# Altium footprint library custom-case.PcbLib: 383 footprints (part 14 of 24)
Each footprint in its own frame and in the unit in brackets; x right, y up, seen from the top. Pads: shape width x height; smd on the part's side, far side on the other; paste and mask are expansions set on the pad; w line width, h text height; cw(c..) or ccw(c..) is an arc to the next point about the centre after c.
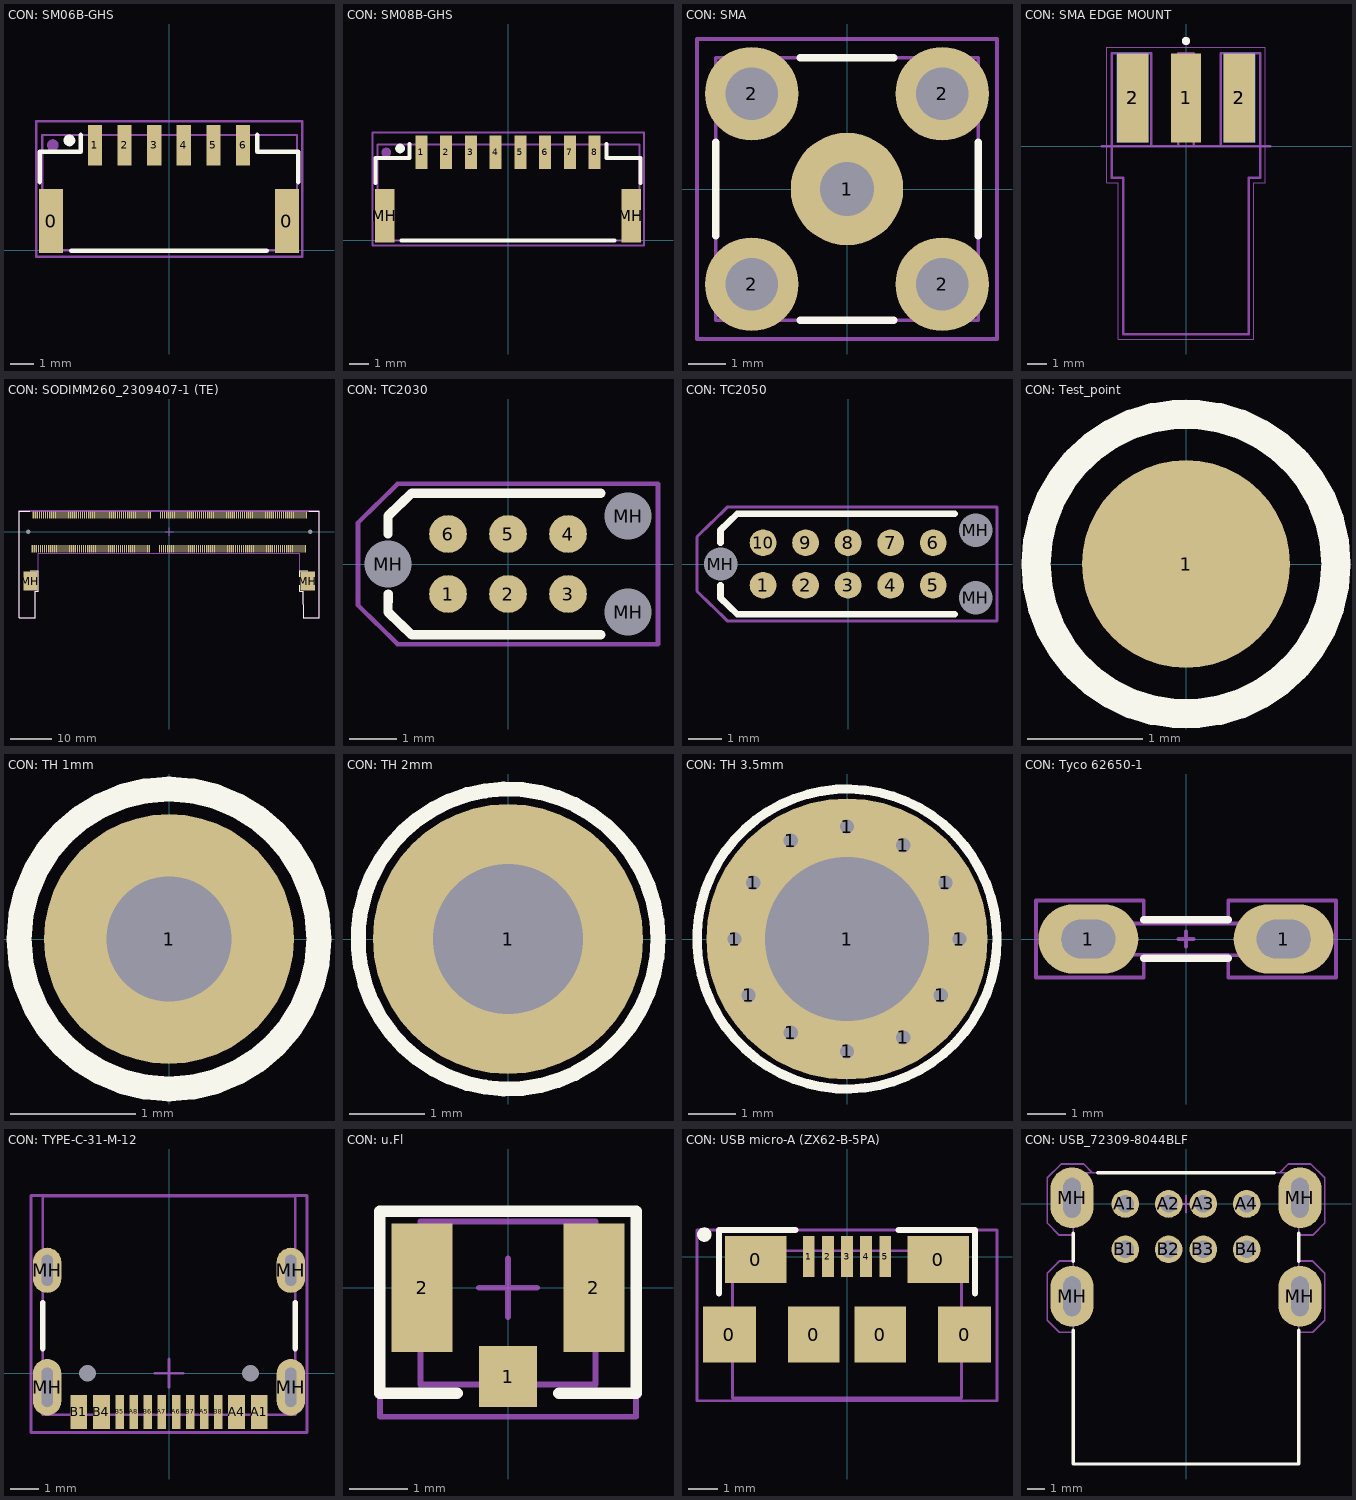
[diagram p13: the footprints below, top view; thin cyan lines are the x and y axes]

## CON: SM06B-GHS [mm]
pads (10):
  rect 1x2.7 smd: 0(-4.975,1.225) 0(4.975,1.225)
  rect 0.6x1.7 smd: 1(-3.125,4.425) 2(-1.875,4.425) 3(-0.625,4.425) 4(0.625,4.425) 5(1.875,4.425) 6(3.125,4.425)
  round 0.5 on Mech1: ""(-4.9,4.425)
  round 0.5 on Top Overlay: ""(-4.2,4.625)
Top Overlay:
  lines w0.2: -5.45,2.875 -5.45,4.15 -3.725,4.15 -3.725,4.85 ; -4.125,-0.025 4.125,-0.025 ; 3.725,4.85 3.725,4.15 5.45,4.15 5.45,2.875
Top Assy:
  lines w0.1: -5.35,0 -5.35,4.85 5.4,4.85 5.4,0 -5.35,0
Size Area:
  lines w0.1: -5.6,-0.275 -5.6,5.425 5.625,5.425 5.625,-0.275 -5.6,-0.275
3D body "SM06B-GHS-TB.STEP": height 4.33, standoff -0.02, extent -5.35,0 5.4,4.85

## CON: SM08B-GHS [mm]
pads (12):
  rect 0.6x1.7 smd: 1(-4.375,4.45) 2(-3.125,4.45) 3(-1.875,4.45) 4(-0.625,4.45) 5(0.625,4.45) 6(1.875,4.45) 7(3.125,4.45) 8(4.375,4.45)
  rect 1x2.7 smd: MH(-6.225,1.25) MH(6.225,1.25)
  round 0.5 on Mech1: ""(-6.15,4.45)
  round 0.5 on Top Overlay: ""(-5.45,4.65)
Top Overlay:
  lines w0.2: -6.7,2.9 -6.7,4.175 -4.975,4.175 -4.975,4.875 ; -5.375,0 5.375,0 ; 4.975,4.875 4.975,4.175 6.7,4.175 6.7,2.9
Top Assy:
  lines w0.1: 6.65,0 -6.6,0 -6.6,4.85 6.65,4.85 6.65,0.05
Size Area:
  lines w0.1: -6.85,-0.25 -6.85,5.45 6.875,5.45 6.875,-0.25 -6.85,-0.25
3D body "SM08B-GHS-TB.stp": height 4.25, standoff -0.05, extent -6.625,0 6.625,4.85

## CON: SMA [mm]
pads (5):
  round 3 hole 1.45: 1(0,0)
  round 2.5 hole 1.4: 2(-2.54,-2.54) 2(-2.54,2.54) 2(2.54,-2.54) 2(2.54,2.54)
Top Overlay:
  lines w0.2: -3.5,-1.25 -3.5,1.25 ; -1.25,-3.5 1.25,-3.5 ; -1.25,3.5 1.25,3.5 ; 3.5,-1.25 3.5,1.25
Top Assy:
  lines w0.1: -3.5,-3.5 -3.5,3.5 3.5,3.5 3.5,-3.5 -3.5,-3.5
Size Area:
  lines w0.1: -0.5,0 0.5,0 ; 0,-0.5 0,0.5 ; -4,-4 4,-4 4,4 -4,4 -4,-4
3D body "SMA_connector.STEP": height 9.53, standoff -3.94, extent -3.5,-3.5 3.5,3.5

## CON: SMA EDGE MOUNT [mm]
pads (5):
  rect 1.5x4.5 smd: 1(0,2.45)
  rect 1.6x4.5 smd far side: 2(-2.7,2.45) 2(2.7,2.45)
  rect 1.6x4.5 smd: 2(-2.7,2.45) 2(2.7,2.45)
Top Overlay:
  circle w0.2: c0,5.325 r0.1
Top Assy:
  lines w0.05: -4,-1.85 -3.425,-1.85 -3.425,-9.75 3.425,-9.75 3.425,-1.85 4.005,-1.85 4.005,5 -4,5 -4,-1.85
  lines w0.127: -4.25,0 -3.76,0 ; 4.25,0 3.76,0 ; -3.76,0 -3.76,4.7 -1.75,4.7 -1.75,0 -3.76,0 ; -3.76,0 -0.39,0 ; -3.76,0 -3.76,-1.6 -3.175,-1.6 -3.175,-9.5 3.175,-9.5 3.175,-1.6 3.76,-1.6 3.76,0 ; -0.39,0 -0.39,4.7 0.39,4.7 0.39,0 ; -0.39,0 0.39,0 ; 0.39,0 3.76,0 ; 3.76,0 1.75,0 1.75,4.7 3.76,4.7 3.76,0
3D model:
  circle w0.2: c0,5.325 r0.1
Size Area:
  lines w0.05: -4.005,-1.85 -3.425,-1.85 -3.425,-9.75 3.425,-9.75 3.425,-1.85 4.005,-1.85 4.005,5 -4.005,5 -4.005,-1.85
3D body "step_temp.STEP": height 3.55, standoff -2.8, extent -3.25,-9.165 3.1,4.165

## CON: SODIMM260_2309407-1 (TE) [mm]
pads (264):
  rect 0.3x1.75 smd mask+0.1: 1(33.375,4.1) 2(33.125,-4.1) 3(32.875,4.1) 4(32.625,-4.1) 5(32.375,4.1) 6(32.125,-4.1) 7(31.875,4.1) 8(31.625,-4.1) 9(31.375,4.1) 10(31.125,-4.1) 11(30.875,4.1) 12(30.625,-4.1) 13(30.375,4.1) 14(30.125,-4.1) 15(29.875,4.1) 16(29.625,-4.1) 17(29.375,4.1) 18(29.125,-4.1) 19(28.875,4.1) 20(28.625,-4.1) 21(28.375,4.1) 22(28.125,-4.1) 23(27.875,4.1) 24(27.625,-4.1) 25(27.375,4.1) 26(27.125,-4.1) 27(26.875,4.1) 28(26.625,-4.1) 29(26.375,4.1) 30(26.125,-4.1) 31(25.875,4.1) 32(25.625,-4.1) 33(25.375,4.1) 34(25.125,-4.1) 35(24.875,4.1) 36(24.625,-4.1) 37(24.375,4.1) 38(24.125,-4.1) 39(23.875,4.1) 40(23.625,-4.1) 41(23.375,4.1) 42(23.125,-4.1) 43(22.875,4.1) 44(22.625,-4.1) 45(22.375,4.1) 46(22.125,-4.1) 47(21.875,4.1) 48(21.625,-4.1) 49(21.375,4.1) 50(21.125,-4.1) 51(20.875,4.1) 52(20.625,-4.1) 53(20.375,4.1) 54(20.125,-4.1) 55(19.875,4.1) 56(19.625,-4.1) 57(19.375,4.1) 58(19.125,-4.1) 59(18.875,4.1) 60(18.625,-4.1) 61(18.375,4.1) 62(18.125,-4.1) 63(17.875,4.1) 64(17.625,-4.1) 65(17.375,4.1) 66(17.125,-4.1) 67(16.875,4.1) 68(16.625,-4.1) 69(16.375,4.1) 70(16.125,-4.1) 71(15.875,4.1) 72(15.625,-4.1) 73(15.375,4.1) 74(15.125,-4.1) 75(14.875,4.1) 76(14.625,-4.1) 77(14.375,4.1) 78(14.125,-4.1) 79(13.875,4.1) 80(13.625,-4.1) 81(13.375,4.1) 82(13.125,-4.1) 83(12.875,4.1) 84(12.625,-4.1) 85(12.375,4.1) 86(12.125,-4.1) 87(11.875,4.1) 88(11.625,-4.1) 89(11.375,4.1) 90(11.125,-4.1) 91(10.875,4.1) 92(10.625,-4.1) 93(10.375,4.1) 94(10.125,-4.1) 95(9.875,4.1) 96(9.625,-4.1) 97(9.375,4.1) 98(9.125,-4.1) 99(8.875,4.1) 100(8.625,-4.1) 101(8.375,4.1) 102(8.125,-4.1) 103(7.875,4.1) 104(7.625,-4.1) 105(7.375,4.1) 106(7.125,-4.1) 107(6.875,4.1) 108(6.625,-4.1) 109(6.375,4.1) 110(6.125,-4.1) 111(5.875,4.1) 112(5.625,-4.1) 113(5.375,4.1) 114(5.125,-4.1) 115(4.875,4.1) 116(4.625,-4.1) 117(4.375,4.1) 118(4.125,-4.1) 119(3.875,4.1) 120(3.625,-4.1) 121(3.375,4.1) 122(3.125,-4.1) 123(2.875,4.1) 124(2.625,-4.1) 125(2.375,4.1) 126(2.125,-4.1) 127(1.875,4.1) 128(1.625,-4.1) 129(1.375,4.1) 130(1.125,-4.1) 131(0.875,4.1) 132(0.625,-4.1) 133(0.375,4.1) 134(0.125,-4.1) 135(-0.125,4.1) 136(-0.375,-4.1) 137(-0.625,4.1) 138(-0.875,-4.1) 139(-1.125,4.1) 140(-1.375,-4.1) 141(-1.625,4.1) 142(-1.875,-4.1) 143(-2.125,4.1) 144(-2.375,-4.1) 145(-4.625,4.1) 146(-4.875,-4.1) 147(-5.125,4.1) 148(-5.375,-4.1) 149(-5.625,4.1) 150(-5.875,-4.1) 151(-6.125,4.1) 152(-6.375,-4.1) 153(-6.625,4.1) 154(-6.875,-4.1) 155(-7.125,4.1) 156(-7.375,-4.1) 157(-7.625,4.1) 158(-7.875,-4.1) 159(-8.125,4.1) 160(-8.375,-4.1) 161(-8.625,4.1) 162(-8.875,-4.1) 163(-9.125,4.1) 164(-9.375,-4.1) 165(-9.625,4.1) 166(-9.875,-4.1) 167(-10.125,4.1) 168(-10.375,-4.1) 169(-10.625,4.1) 170(-10.875,-4.1) 171(-11.125,4.1) 172(-11.375,-4.1) 173(-11.625,4.1) 174(-11.875,-4.1) 175(-12.125,4.1) 176(-12.375,-4.1) 177(-12.625,4.1) 178(-12.875,-4.1) 179(-13.125,4.1) 180(-13.375,-4.1) 181(-13.625,4.1) 182(-13.875,-4.1) 183(-14.125,4.1) 184(-14.375,-4.1) 185(-14.625,4.1) 186(-14.875,-4.1) 187(-15.125,4.1) 188(-15.375,-4.1) 189(-15.625,4.1) 190(-15.875,-4.1) 191(-16.125,4.1) 192(-16.375,-4.1) 193(-16.625,4.1) 194(-16.875,-4.1) 195(-17.125,4.1) 196(-17.375,-4.1) 197(-17.625,4.1) 198(-17.875,-4.1) 199(-18.125,4.1) 200(-18.375,-4.1) 201(-18.625,4.1) 202(-18.875,-4.1) 203(-19.125,4.1) 204(-19.375,-4.1) 205(-19.625,4.1) 206(-19.875,-4.1) 207(-20.125,4.1) 208(-20.375,-4.1) 209(-20.625,4.1) 210(-20.875,-4.1) 211(-21.125,4.1) 212(-21.375,-4.1) 213(-21.625,4.1) 214(-21.875,-4.1) 215(-22.125,4.1) 216(-22.375,-4.1) 217(-22.625,4.1) 218(-22.875,-4.1) 219(-23.125,4.1) 220(-23.375,-4.1) 221(-23.625,4.1) 222(-23.875,-4.1) 223(-24.125,4.1) 224(-24.375,-4.1) 225(-24.625,4.1) 226(-24.875,-4.1) 227(-25.125,4.1) 228(-25.375,-4.1) 229(-25.625,4.1) 230(-25.875,-4.1) 231(-26.125,4.1) 232(-26.375,-4.1) 233(-26.625,4.1) 234(-26.875,-4.1) 235(-27.125,4.1) 236(-27.375,-4.1) 237(-27.625,4.1) 238(-27.875,-4.1) 239(-28.125,4.1) 240(-28.375,-4.1) 241(-28.625,4.1) 242(-28.875,-4.1) 243(-29.125,4.1) 244(-29.375,-4.1) 245(-29.625,4.1) 246(-29.875,-4.1) 247(-30.125,4.1) 248(-30.375,-4.1) 249(-30.625,4.1) 250(-30.875,-4.1) 251(-31.125,4.1) 252(-31.375,-4.1) 253(-31.625,4.1) 254(-31.875,-4.1) 255(-32.125,4.1) 256(-32.375,-4.1) 257(-32.625,4.1) 258(-32.875,-4.1) 259(-33.125,4.1) 260(-33.375,-4.1)
  round 0 hole 1.1 mask+0.1: MH(-34.4,0) MH(34.4,0)
  rect 3.5x4.6 smd mask+0.1: MH(-33.8,-12) MH(33.8,-12)
Top Overlay:
  lines w0.2: -34,5 -36.5,5 -36.6,-20.9 -32.611,-20.9 -32.586,-14.5 -31.85,-14.5 -31.85,-9.5 -33.8,-9.5 ; 33.8,-9.5 31.85,-9.5 31.85,-14.5 32.592,-14.5 32.617,-20.9 36.5,-20.9 36.5,5 34,5
Top Assy:
  lines w0.1: -36.6,-20.9 -32.611,-20.9 -32.586,-14.5 -31.85,-14.5 -31.85,-5.25 31.85,-5.25 31.85,-14.5 32.592,-14.5 32.617,-20.9 36.5,-20.9 36.5,5 -36.5,5 -36.6,-20.9
Size Area:
  lines w0.1: -1,0 1,0 ; 0,-1 0,1 ; -36.6,-20.9 -32.611,-20.9 -32.586,-14.5 -31.85,-14.5 -31.85,-5.25 31.85,-5.25 31.85,-14.5 32.592,-14.5 32.617,-20.9 36.5,-20.9 36.5,5.25 -36.499,5.25 -36.6,-20.9
3D body "SODIMM260 v3.step": height 4.1, standoff -0.4, extent -36.5,-20.85 36.5,5

## CON: TC2030 [mm]
pads (9):
  round 0.8 smd: 1(-1.27,-0.635) 2(0,-0.635) 3(1.27,-0.635) 4(1.27,0.635) 5(0,0.635) 6(-1.27,0.635)
  round 0.8 hole 1: MH(-2.54,0) MH(2.54,-1.016) MH(2.54,1.016)
Top Overlay:
  lines w0.2: -2.54,0.635 -2.54,1.016 -2.04,1.5 -1.54,1.5 1.96,1.5 ; -2.537,-0.635 -2.54,-1.016 -2.04,-1.5 -1.54,-1.5 1.96,-1.5
Size Area:
  lines w0.1: -3.175,-0.875 -3.175,0.875 -2.337,1.7 3.175,1.7 3.175,-1.7 -2.337,-1.7 -3.175,-0.875

## CON: TC2050 [mm]
pads (13):
  round 0.8 smd: 1(-2.54,-0.635) 2(-1.27,-0.635) 3(0,-0.635) 4(1.27,-0.635) 5(2.54,-0.635) 6(2.54,0.635) 7(1.27,0.635) 8(0,0.635) 9(-1.27,0.635) 10(-2.54,0.635)
  round 0.8 hole 1: MH(-3.81,0) MH(3.81,-1.015) MH(3.81,1.015)
Top Overlay:
  lines w0.2: -3.81,-0.635 -3.81,-1.016 -3.31,-1.5 -2.81,-1.5 3.175,-1.5 ; -3.81,0.635 -3.81,1.016 -3.31,1.5 -2.81,1.5 3.175,1.5
Size Area:
  lines w0.1: -4.513,-0.808 -4.513,0.808 -3.607,1.7 4.445,1.7 4.445,-1.7 -3.607,-1.7 -4.513,-0.808

## CON: Test_point [mm]
pads (1):
  round 1.8 smd: 1(0,0)
Top Overlay:
  circle w0.254: c0,0 r1.3

## CON: TH 1mm [mm]
pads (1):
  round 2 hole 1 mask+0.075: 1(0,0)
Top Overlay:
  circle w0.2: c0,0 r1.2
Size Area:
  circle w0.1: c0,0 r1.2
  lines w0.1: -0.5,0 0.5,0 ; 0,-0.5 0,0.5

## CON: TH 2mm [mm]
pads (1):
  round 3.6 hole 2 mask+0.075: 1(0,0)
Top Overlay:
  circle w0.2: c0,0 r2
Size Area:
  circle w0.1: c0,0 r2
  lines w0.1: -0.5,0 0.5,0 ; 0,-0.5 0,0.5

## CON: TH 3.5mm [mm]
pads (13):
  round 0.7 hole 0.3: 1(-2.4,0) 1(-2.1,-1.2) 1(-2,1.2) 1(-1.2,-2) 1(-1.2,2.1) 1(0,-2.4) 1(0,2.4) 1(1.2,-2.1) 1(1.2,2) 1(2,-1.2) 1(2.1,1.2) 1(2.4,0)
  round 6 hole 3.5: 1(0,0)
Top Overlay:
  circle w0.2: c0,0 r3.2

## CON: Tyco 62650-1 [mm]
pads (2):
  oval 2.6x1.8 hole 1 slot 1.4 at 0 deg mask+0.075: 1(-2.54,0) 1(2.54,0)
Top Overlay:
  lines w0.2: -1.1,-0.5 1.1,-0.5 ; -1.1,0.5 1.1,0.5
Top Assy:
  lines w0.1: -3.563,-0.405 -3.563,0.4 3.55,0.4 3.55,-0.425 -3.563,-0.405
Size Area:
  lines w0.1: -0.2,0 0.2,0 ; 0,-0.2 0,0.2 ; -3.9,-1 -3.9,1 -1.1,1 -1.1,0.4 1.1,0.4 1.1,1 3.9,1 3.9,-1 1.1,-1 1.1,-0.418 -1.1,-0.412 -1.1,-1 -3.9,-1
3D body "Tyco 62650-1 v2.step": height 9.24, standoff -3.13, extent -3.555,-0.4 3.555,0.4

## CON: TYPE-C-31-M-12 [mm]
pads (18):
  rect 0.6x1.2 smd mask+0.075: A1(3.2,-1.375) A4(2.4,-1.375) B1(-3.2,-1.375) B4(-2.4,-1.375)
  rect 0.3x1.2 smd mask+0.075: A5(1.25,-1.375) A6(0.25,-1.375) A7(-0.25,-1.375) A8(-1.25,-1.375) B5(-1.75,-1.375) B6(-0.75,-1.375) B7(0.75,-1.375) B8(1.75,-1.375)
  oval 1x2 hole 0.4 slot 1.4 at 90 deg mask+0.075: MH(-4.32,-0.5) MH(4.32,-0.5)
  oval 1x1.6 hole 0.4 slot 1.1 at 90 deg mask+0.075: MH(-4.32,3.65) MH(4.32,3.65)
  round 0 hole 0.6 mask+0.075: MH(-2.89,0) MH(2.89,0)
Top Overlay:
  lines w0.2: -4.475,0.875 -4.475,2.5 ; 4.475,0.875 4.475,2.5
Top Assy:
  lines w0.1: -4.475,-1.475 -4.475,6.275 4.475,6.275 4.475,-1.475 -4.475,-1.475
Size Area:
  lines w0.1: -0.5,0 0.5,0 ; 0,-0.5 0,0.5 ; -4.9,-2.1 4.9,-2.1 4.9,6.3 -4.9,6.3 -4.9,-2.1
3D body "User Library-USB - C.STEP": height 3.26, standoff -1, extent -4.475,-1.475 4.475,6.275

## CON: u.Fl [mm]
height 1.5
pads (3):
  rect 1x1.05 smd: 1(0,-1.525)
  rect 1.05x2.2 smd: 2(-1.475,0) 2(1.475,0)
Top Overlay:
  lines w0.2: -0.875,-1.813 -2.2,-1.813 -2.2,1.312 2.2,1.312 2.2,-1.813 0.875,-1.813
Top Assy:
  lines w0.1: -1.5,-1.663 1.5,-1.663 1.5,1.137 -1.5,1.137 -1.5,-1.663
Size Area:
  lines w0.1: -0.5,0 0.5,0 ; 0,-0.5 0,0.5 ; -2.2,-2.213 -2.2,1.312 2.2,1.312 2.2,-2.213 -2.2,-2.213
3D body "IPX.step": height 1.27, standoff -0.01, extent -1.5,-1.712 1.5,1.138

## CON: USB micro-A (ZX62-B-5PA) [mm]
height 5
pads (12):
  rect 1.8x1.9 smd: 0(-4,-2.65) 0(4,-2.65)
  rect 2.1x1.6 smd: 0(-3.1,-0.1) 0(3.1,-0.1)
  rect 1.75x1.9 smd: 0(-1.125,-2.65) 0(1.125,-2.65)
  rect 0.4x1.4 smd: 1(-1.3,0) 2(-0.65,0) 3(0,0) 4(0.65,0) 5(1.3,0)
  round 0.5 on Top Overlay: ""(-4.85,0.75)
Top Overlay:
  lines w0.2: -4.35,-1.25 -4.35,0.9 -1.75,0.9 ; 1.75,0.9 4.35,0.9 4.35,-1.25
Top Assy:
  lines w0.1: -3.9,-4.8 -3.9,0.2 3.9,0.2 3.9,-4.8 -3.9,-4.8
Size Area:
  lines w0.1: -5.1,-4.9 -5.1,0.9 5.1,0.9 5.1,-4.9 -5.1,-4.9
3D body "User Library-micro usb SMD.STEP": height 2.68, standoff -0.02, extent -3.9,-4.8 3.9,0.2

## CON: USB_72309-8044BLF [mm] "USB2.0 to 2 ports, Amphenol"
pads (12):
  round 1.6 hole 1 mask+0.102: A1(-3.5,0) A2(-1,0) A3(1,0) A4(3.5,0) B1(-3.5,-2.62) B2(-1,-2.62) B3(1,-2.62) B4(3.5,-2.62)
  rrect100% 2.5x3.5 hole 1 slot 2.3 at 90 deg mask+0.102: MH(-6.57,-5.33) MH(-6.57,0.35) MH(6.57,-5.33) MH(6.57,0.35)
Top Overlay:
  lines w0.2: -6.5,-7.3 -6.5,-15 6.5,-15 6.5,-7.3 ; -6.5,-3.3 -6.5,-1.7 ; -5.1,1.8 5.1,1.8 ; 6.5,-3.3 6.5,-1.7
Top Assy:
  lines w0.1: -6.5,-15 6.5,-15 6.5,1.8 -6.5,1.8 -6.5,-15
Size Area:
  lines w0.1: -0.5,0 0.5,0 ; 0,-0.5 0,0.5 ; -8,-6.7 -8,-4 -7.3,-3.3 -6.5,-3.3 -6.5,-1.8 -7.3,-1.8 -8,-1.1 -8,1.5 -7.2,2.3 -6.5,2.3 -5.9,2.3 -5.4,1.8 0,1.8 5.4,1.8 5.9,2.3 6.5,2.3 7.2,2.3 8,1.5 8,-1.1 7.3,-1.8 6.5,-1.8 6.5,-3.3 7.3,-3.3 8,-4 8,-6.7 7.3,-7.4 6.5,-7.4 6.5,-15 -6.5,-15 -6.5,-7.4 -7.3,-7.4 -8,-6.7
3D body "72309-8044BLFc v2.step": height 16.19, standoff -2.79, extent -7.5,-16.4 7.5,1.8